# Altium footprint library PCBLIB.PcbLib: 775 footprints (part 23 of 49)
Each footprint in its own frame and in the unit in brackets; x right, y up, seen from the top. Pads: shape width x height; smd on the part's side, far side on the other; paste and mask are expansions set on the pad; w line width, h text height; cw(c..) or ccw(c..) is an arc to the next point about the centre after c.
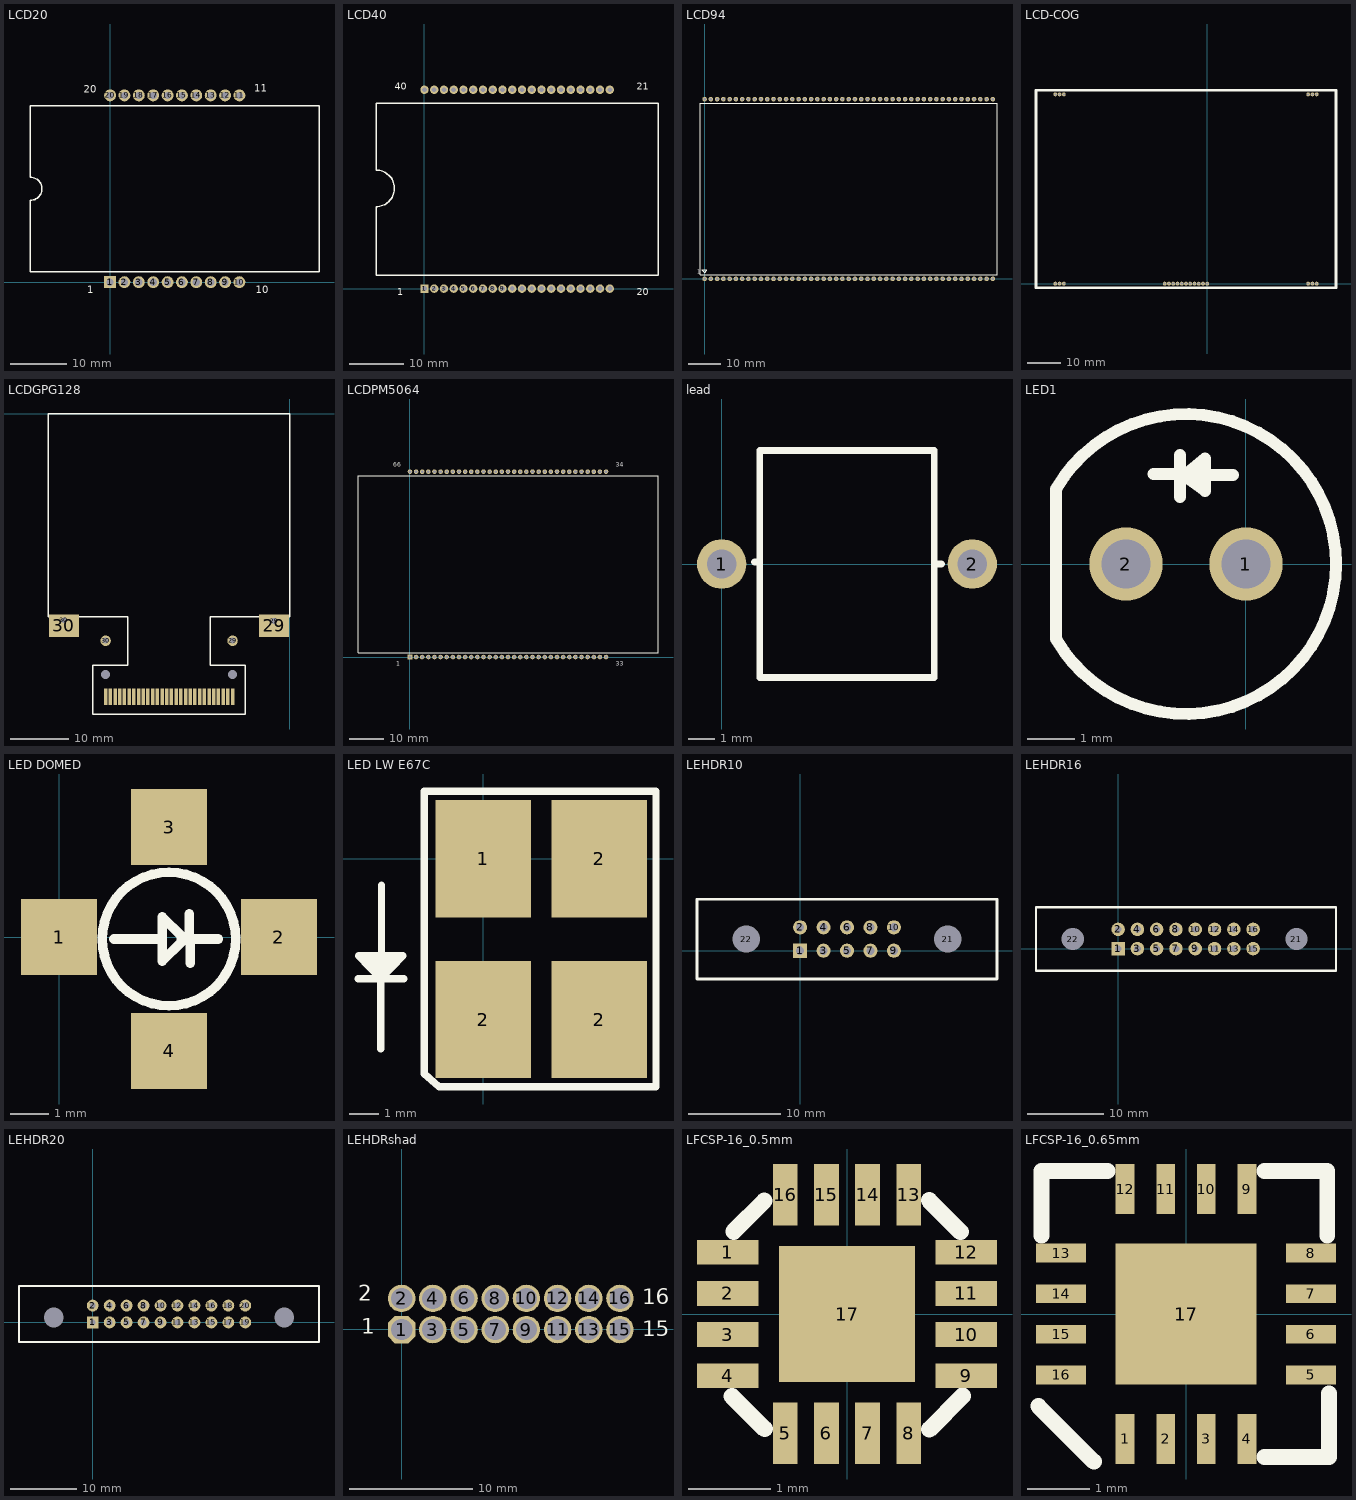
[diagram p22: the footprints below, top view; thin cyan lines are the x and y axes]

## LCD20 [mm]
pads (20):
  rect 2.1x2.1 hole 1.27: 1(0,0)
  round 2.1 hole 1.27: 2(2.54,0) 3(5.08,0) 4(7.62,0) 5(10.16,0) 6(12.7,0) 7(15.24,0) 8(17.78,0) 9(20.32,0) 10(22.86,0) 11(22.86,33.02) 12(20.32,33.02) 13(17.78,33.02) 14(15.24,33.02) 15(12.7,33.02) 16(10.16,33.02) 17(7.62,33.02) 18(5.08,33.02) 19(2.54,33.02) 20(0,33.02)
TopOverlay:
  lines w0.254: -14.072,1.829 -14.072,14.478 ccw(c-14.072,16.51) -14.072,18.542 -14.072,31.191 36.928,31.191 36.928,1.829 -14.072,1.829
  text "10" at 25.705,-1.956 h1.27
  text "1" at -4.039,-1.956 h1.27
  text "11" at 25.476,33.63 h1.27
  text "20" at -4.648,33.452 h1.27
Mechanical4:
  text ".114" at 0,0 h0.03

## LCD40 [mil]
pads (40):
  rect 61x61 hole 36: 1(0,0)
  round 61 hole 36: 2(70.87,0) 3(141.73,0) 4(212.6,0) 5(283.46,0) 6(354.33,0) 7(425.2,0) 8(496.06,0) 9(566.93,0) 10(637.8,0) 11(708.66,0) 12(779.53,0) 13(850.39,0) 14(921.26,0) 15(992.13,0) 16(1062.99,0) 17(1133.86,0) 18(1204.72,0) 19(1275.59,0) 20(1346.46,0) 21(1346.46,1444.88) 22(1275.59,1444.88) 23(1204.72,1444.88) 24(1133.86,1444.88) 25(1062.99,1444.88) 26(992.13,1444.88) 27(921.26,1444.88) 28(850.39,1444.88) 29(779.53,1444.88) 30(708.66,1444.88) 31(637.8,1444.88) 32(566.93,1444.88) 33(496.06,1444.88) 34(425.2,1444.88) 35(354.33,1444.88) 36(283.46,1444.88) 37(212.6,1444.88) 38(141.73,1444.88) 39(70.87,1444.88) 40(0,1444.88)
TopOverlay:
  lines w10: -350.39,98.43 1696.85,98.43 1696.85,1346.46 -350.39,1346.46 -350.39,860.74 cw(c-350.39,728.35) -350.39,595.95 -350.39,98.43
  text "21" at 1543.31,1445 h50
  text "1" at -196.85,-47.24 h50
  text "20" at 1543.31,-47.24 h50
  text "40" at -214,1444 h50
Mechanical4:
  text ".114" at 0,0 h1
  text "0.0000" at 0,1444.88 h1

## LCD94 [mil]
pads (94):
  round 55 hole 30: 1(0,0) 2(75,0) 3(150,0) 4(225,0) 5(300,0) 6(375,0) 7(450,0) 8(525,0) 9(600,0) 10(675,0) 11(750,0) 12(825,0) 13(900,0) 14(975,0) 15(1050,0) 16(1125,0) 17(1200,0) 18(1275,0) 19(1350,0) 20(1425,0) 21(1500,0) 22(1575,0) 23(1650,0) 24(1725,0) 25(1800,0) 26(1875,0) 27(1950,0) 28(2025,0) 29(2100,0) 30(2175,0) 31(2250,0) 32(2325,0) 33(2400,0) 34(2475,0) 35(2550,0) 36(2625,0) 37(2700,0) 38(2775,0) 39(2850,0) 40(2925,0) 41(3000,0) 42(3075,0) 43(3150,0) 44(3225,0) 45(3300,0) 46(3375,0) 47(3450,0) 48(3450,2150) 49(3375,2150) 50(3300,2150) 51(3225,2150) 52(3150,2150) 53(3075,2150) 54(3000,2150) 55(2925,2150) 56(2850,2150) 57(2775,2150) 58(2700,2150) 59(2625,2150) 60(2550,2150) 61(2475,2150) 62(2400,2150) 63(2325,2150) 64(2250,2150) 65(2175,2150) 66(2100,2150) 67(2025,2150) 68(1950,2150) 69(1875,2150) 70(1800,2150) 71(1725,2150) 72(1650,2150) 73(1575,2150) 74(1500,2150) 75(1425,2150) 76(1350,2150) 77(1275,2150) 78(1200,2150) 79(1125,2150) 80(1050,2150) 81(975,2150) 82(900,2150) 83(825,2150) 84(750,2150) 85(675,2150) 86(600,2150) 87(525,2150) 88(450,2150) 89(375,2150) 90(300,2150) 91(225,2150) 92(150,2150) 93(75,2150) 94(0,2150)
TopOverlay:
  lines w8: -25,100 0,75 25,100 25,110 -25,110 -25,100
  lines w12: -50,50 -50,2100 943.19,2100 3500,2100 3500,50 -50,50
  text "1" at -90.81,58.89 h50
Mechanical4:
  text ".150" at 0,0 h1

## LCD-COG [mil]
height 390
pads (23):
  round 45 hole 25: 1(0,0) 2(-50,0) 3(-100,0) 4(-150,0) 5(-200,0) 6(-250,0) 7(-300,0) 8(-350,0) 9(-400,0) 10(-450,0) 11(-500,0) 12(-1785,0) 13(-1735,0) 14(-1685,0) 15(1186,0) 16(1236,0) 17(1286,0) 18(-1785,2224) 19(-1735,2224) 20(-1685,2224) 21(1186,2224) 22(1236,2224) 23(1286,2224)
TopOverlay:
  lines w30: -2012,-50 1513,-50 1513,2274 -2012,2274 -2012,-50
Mechanical4:
  text ".484" at -1982,0 h1

## LCDGPG128 [mm]
pads (36):
  round 0 hole 1.499: 0(-31.292,-44.359) 0(-9.692,-44.359)
  rect 0.6x2.8 smd: 1(-31.292,-48.109) 2(-30.492,-48.109) 3(-29.692,-48.109) 4(-28.892,-48.109) 5(-28.092,-48.109) 6(-27.292,-48.109) 7(-26.492,-48.109) 8(-25.692,-48.109) 9(-24.892,-48.109) 10(-24.092,-48.109) 11(-23.292,-48.109) 12(-22.492,-48.109) 13(-21.692,-48.109) 14(-20.892,-48.109) 15(-20.092,-48.109) 16(-19.292,-48.109) 17(-18.492,-48.109) 18(-17.692,-48.109) 19(-16.892,-48.109) 20(-16.092,-48.109) 21(-15.292,-48.109) 22(-14.492,-48.109) 23(-13.692,-48.109) 24(-12.892,-48.109) 25(-12.092,-48.109) 26(-11.292,-48.109) 27(-10.492,-48.109) 28(-9.692,-48.109)
  round 1.778 hole 1.016: 29(-9.692,-38.584) 30(-31.292,-38.584)
  rect 5.08x3.81 smd: 29(-2.616,-36.017) 30(-38.379,-36.017)
  round 1.778 hole 1.016 unplated: 29(-2.616,-35.23) 30(-38.379,-35.103)
TopOverlay:
  lines w0.254: -27.527,-34.52 -27.527,-42.795 -33.527,-42.795 -33.527,-51.055 -7.527,-51.055 -7.527,-42.795 -13.527,-42.795 -13.527,-34.52 ; -27.51,-34.52 -41.02,-34.52 -41.02,0 0,0 0,-34.52 -13.51,-34.52

## LCDPM5064 [mm]
pads (66):
  rect 1.34x1.34 hole 0.8: 1(0,0)
  round 1.34 hole 0.8: 2(1.8,0) 3(3.6,0) 4(5.4,0) 5(7.2,0) 6(9,0) 7(10.8,0) 8(12.6,0) 9(14.4,0) 10(16.2,0) 11(18,0) 12(19.8,0) 13(21.6,0) 14(23.4,0) 15(25.2,0) 16(27,0) 17(28.8,0) 18(30.6,0) 19(32.4,0) 20(34.2,0) 21(36,0) 22(37.8,0) 23(39.6,0) 24(41.4,0) 25(43.2,0) 26(45,0) 27(46.8,0) 28(48.6,0) 29(50.4,0) 30(52.2,0) 31(54,0) 32(55.8,0) 33(57.6,0) 34(57.6,54.47) 35(55.8,54.47) 36(54,54.47) 37(52.2,54.47) 38(50.4,54.47) 39(48.6,54.47) 40(46.8,54.47) 41(45,54.47) 42(43.2,54.47) 43(41.4,54.47) 44(39.6,54.47) 45(37.8,54.47) 46(36,54.47) 47(34.2,54.47) 48(32.4,54.47) 49(30.6,54.47) 50(28.8,54.47) 51(27,54.47) 52(25.2,54.47) 53(23.4,54.47) 54(21.6,54.47) 55(19.8,54.47) 56(18,54.47) 57(16.2,54.47) 58(14.4,54.47) 59(12.6,54.47) 60(10.8,54.47) 61(9,54.47) 62(7.2,54.47) 63(5.4,54.47) 64(3.6,54.47) 65(1.8,54.47) 66(0,54.47)
TopOverlay:
  lines w0.254: -15.27,1.2 72.87,1.2 72.87,53.27 -15.27,53.27 -15.27,1.2
  text "66" at -4.851,55.905 h1.27
  text "34" at 60.452,55.905 h1.27
  text "33" at 60.452,-2.515 h1.27
  text "1" at -4.039,-2.515 h1.27

## lead [mil]
pads (2):
  round 74 hole 44: 1(0,0) 2(375,0)
TopOverlay:
  lines w10: 49,3 57,3 ; 318,0 329,0 ; 57,-170 318,-170 318,170 57,170 57,-170

## LED1 [mil]
pads (2):
  round 61 hole 41: 1(0,0) 2(-100,0)
TopOverlay:
  lines w10: -77,75 -53,75 ; -55,56 -55,91 ; -52,74 -34,61 -34,88 -51,74 -11,74 ; -158.25,-62.5 ccw(c-50,0) -158.25,62.5 -158.25,-62.5
Mechanical4:
  text ".720" at -100,0 h1
  text ".910" at -100.21,-0.01 h1
  text ".250" at -100,0 h1

## LED DOMED [mil]
pads (4):
  rect 79x79 smd: 1(0,0) 2(228,0) 3(114,114) 4(114,-118)
TopOverlay:
  circle w10: c114,-2 r69.18
  lines w10: 57,-2 107,-2 ; 127,-5 107,-25 107,-2 ; 127,-2 165,-2 ; 127,1 107,21 107,-2 ; 135,-2 135,24 ; 136,-27 136,-2

## LED LW E67C [mil] "ENHANCED OPTICAL POWER LED"
height 83
pads (4):
  rect 130x159.5 smd: 1(0,0) 2(0,-218.5) 2(158,-218.5) 2(158,0)
TopOverlay:
  lines w10: -170,-163 -108,-163 ; -156,-140 -123,-140 ; -150,-148 -131,-148 ; -140,-149 -139,-163 ; -139,-258 -139,-163 ; -138,-132 -138,-36 ; -139,-163 -169,-132 -109,-132 -139,-163 ; -80,-292 -60,-310 235,-310 235,92 -80,92 -80,-242 -80,-292

## LEHDR10 [mil]
pads (12):
  rect 60x60 hole 35: 1(0,0)
  round 60 hole 35: 2(0,100) 3(100,0) 4(100,100) 5(200,0) 6(200,100) 7(300,0) 8(300,100) 9(400,0) 10(400,100)
  round 60 hole 116: 21(630,50) 22(-230,50)
TopOverlay:
  lines w12: -440,-120 840,-120 840,220 -440,220 -440,-120
Mechanical4:
  text ".2" at 0,0 h1
  text ".340" at -230,50 h1

## LEHDR16 [mil]
pads (18):
  rect 70x70 hole 35: 1(0,0)
  round 70 hole 35: 2(0,100) 3(100,0) 4(100,100) 5(200,0) 6(200,100) 7(300,0) 8(300,100) 9(400,0) 10(400,100) 11(500,0) 12(500,100) 13(600,0) 14(600,100) 15(700,0) 16(700,100)
  round 70 hole 116: 21(925,50) 22(-235,50)
TopOverlay:
  lines w12: -426,-115 1130,-115 1130,215 -426,215 -426,-115
Mechanical4:
  text ".340" at 0,0 h1

## LEHDR20 [mil]
pads (22):
  rect 70x70 hole 35: 1(0,0)
  round 70 hole 35: 2(0,100) 3(100,0) 4(100,100) 5(200,0) 6(200,100) 7(300,0) 8(300,100) 9(400,0) 10(400,100) 11(500,0) 12(500,100) 13(600,0) 14(600,100) 15(700,0) 16(700,100) 17(800,0) 18(800,100) 19(900,0) 20(900,100)
  round 0 hole 116 unplated: MH21(-230,29) MH22(1130,29)
TopOverlay:
  lines w12: -435,-115 1335,-115 1335,215 -435,215 -435,-115
Mechanical4:
  text ".200" at 0,0 h1
  text ".340" at -9,0 h1

## LEHDRshad [mil]
pads (16):
  oct 88x88 hole 68: 1(-1,-1)
  round 88 hole 68: 2(-1,99) 3(99,-1) 4(99,99) 5(199,-1) 6(199,99) 7(299,-1) 8(299,99) 9(399,-1) 10(399,99) 11(499,-1) 12(499,99) 13(599,-1) 14(599,99) 15(699,-1) 16(699,99)
TopOverlay:
  text "15" at 771,-23 h50
  text "16" at 771,80 h50
  text "2" at -141,91 h50
  text ".4" at 0,0 h1
  text "1" at -130,-15 h50
Mechanical4:
  text ".400" at 0,0 h1

## LFCSP-16_0.5mm [mm]
height 1
pads (17):
  rect 0.75x0.3 smd: 1(-1.45,0.75) 2(-1.45,0.25) 3(-1.45,-0.25) 4(-1.45,-0.75) 9(1.45,-0.75) 10(1.45,-0.25) 11(1.45,0.25) 12(1.45,0.75)
  rect 0.3x0.75 smd: 5(-0.75,-1.45) 6(-0.25,-1.45) 7(0.25,-1.45) 8(0.75,-1.45) 13(0.75,1.45) 14(0.25,1.45) 15(-0.25,1.45) 16(-0.75,1.45)
  rect 1.65x1.65 smd: 17(0,0)
TopOverlay:
  lines w0.203: -1.398,-1.002 -1.002,-1.397 ; -1.378,1.003 -1.005,1.378 ; 0.999,1.383 1.381,1 ; 1.001,-1.403 1.405,-0.997
  text "." at -2.099,0.721 h0.51

## LFCSP-16_0.65mm [mm]
height 1
pads (17):
  rect 0.3x0.8 smd: 1(-0.975,-2) 2(-0.325,-2) 3(0.325,-2) 4(0.975,-2) 9(0.975,2) 10(0.325,2) 11(-0.325,2) 12(-0.975,2)
  rect 0.8x0.3 smd: 5(2,-0.975) 6(2,-0.325) 7(2,0.325) 8(2,0.975) 13(-2,0.975) 14(-2,0.325) 15(-2,-0.325) 16(-2,-0.975)
  rect 2.25x2.25 smd: 17(0,0)
TopOverlay:
  lines w0.254: -2.362,-1.473 -1.473,-2.362 ; -2.311,1.254 -2.311,2.286 -1.254,2.286 ; 1.254,-2.286 2.286,-2.286 2.286,-1.27 ; 1.254,2.286 2.261,2.286 2.261,1.254
  text "." at -0.94,-2.667 h0.51